# Altium footprint library domino-rising-cage-clamp.PcbLib: 435 footprints (part 21 of 28)
Each footprint in its own frame and in the unit in brackets; x right, y up, seen from the top. Pads: shape width x height; smd on the part's side, far side on the other; paste and mask are expansions set on the pad; w line width, h text height; cw(c..) or ccw(c..) is an arc to the next point about the centre after c.
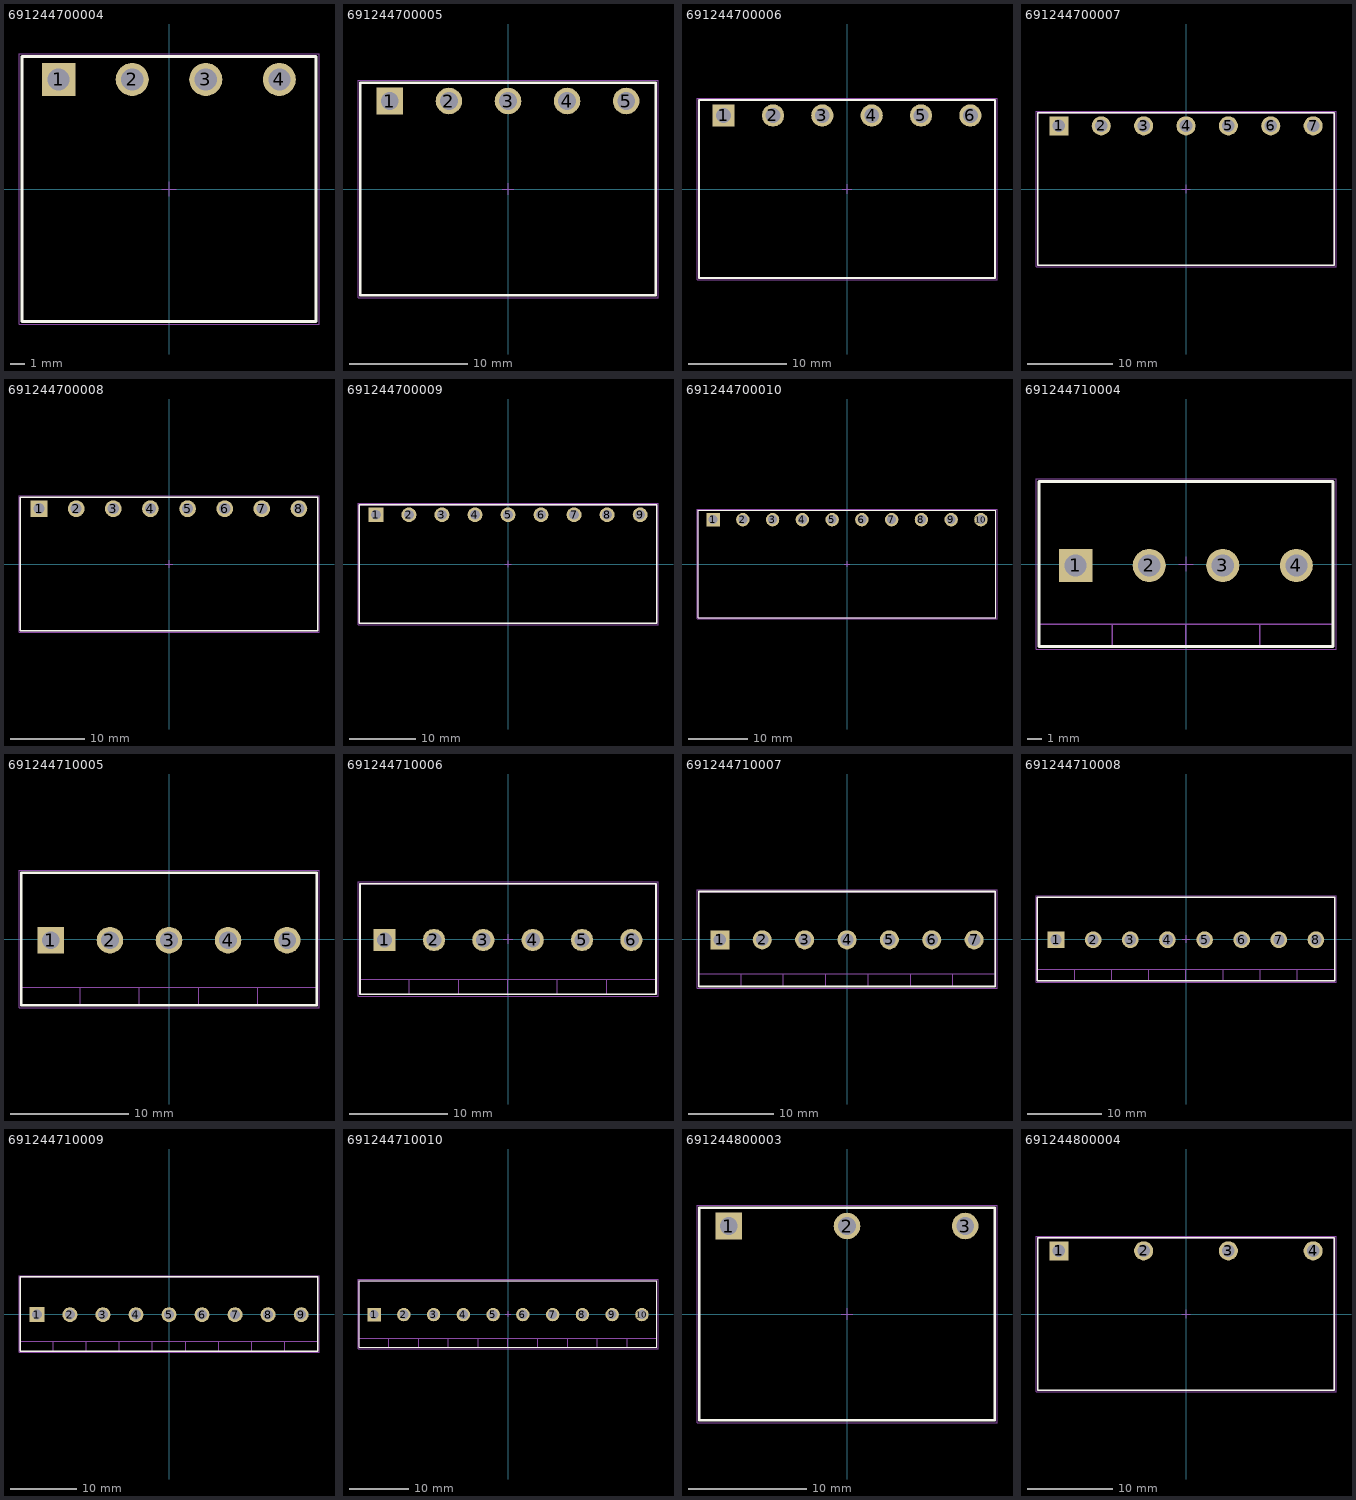
[diagram p20: the footprints below, top view; thin cyan lines are the x and y axes]

## 691244700004 [mm] "Serie 2447 - 5.00 mm _ 4 pins"
height 11.2
pads (4):
  rect 2.25x2.25 hole 1.5: 1(-7.5,7.45)
  round 2.25 hole 1.5: 2(-2.5,7.45) 3(2.5,7.45) 4(7.5,7.45)
Top Overlay:
  lines w0.2: -10,-9 10,-9 10,9 -10,9 -10,-9
Mechanical 13:
  lines w0.1: -10,-9 -10,9 10,9 10,-9 -10,-9
Mechanical 15:
  lines w0.05: -0.5,0 0.5,0 ; 0,-0.5 0,0.5 ; -10.2,-9.2 10.2,-9.2 10.2,9.2 -10.2,9.2 -10.2,-9.2
3D body "691244700004.stp": height 11.3, standoff -3.9, extent -10,-9 10,9

## 691244700005 [mm] "Serie 2447 - 5.00 mm _ 5 pins"
height 11.2
pads (5):
  rect 2.25x2.25 hole 1.5: 1(-10,7.45)
  round 2.25 hole 1.5: 2(-5,7.45) 3(0,7.45) 4(5,7.45) 5(10,7.45)
Top Overlay:
  lines w0.2: -12.5,-9 12.5,-9 12.5,9 -12.5,9 -12.5,-9
Mechanical 13:
  lines w0.1: -12.5,-9 -12.5,9 12.5,9 12.5,-9 -12.5,-9
Mechanical 15:
  lines w0.05: -0.5,0 0.5,0 ; 0,-0.5 0,0.5 ; -12.7,-9.2 12.7,-9.2 12.7,9.2 -12.7,9.2 -12.7,-9.2
3D body "691244700005.stp": height 11.3, standoff -3.9, extent -12.5,-9 12.5,9

## 691244700006 [mm] "Serie 2447 - 5.00 mm _ 6 pins"
height 11.2
pads (6):
  rect 2.25x2.25 hole 1.5: 1(-12.5,7.45)
  round 2.25 hole 1.5: 2(-7.5,7.45) 3(-2.5,7.45) 4(2.5,7.45) 5(7.5,7.45) 6(12.5,7.45)
Top Overlay:
  lines w0.2: -15,-9 15,-9 15,9 -15,9 -15,-9
Mechanical 13:
  lines w0.1: -15,-9 -15,9 15,9 15,-9 -15,-9
Mechanical 15:
  lines w0.05: -0.5,0 0.5,0 ; 0,-0.5 0,0.5 ; -15.2,-9.2 15.2,-9.2 15.2,9.2 -15.2,9.2 -15.2,-9.2
3D body "691244700006.stp": height 11.3, standoff -3.9, extent -15,-9 15,9

## 691244700007 [mm] "Serie 2447 - 5.00 mm _ 7 pins"
height 11.2
pads (7):
  rect 2.25x2.25 hole 1.5: 1(-15,7.45)
  round 2.25 hole 1.5: 2(-10,7.45) 3(-5,7.45) 4(0,7.45) 5(5,7.45) 6(10,7.45) 7(15,7.45)
Top Overlay:
  lines w0.2: -17.5,-9 17.5,-9 17.5,9 -17.5,9 -17.5,-9
Mechanical 13:
  lines w0.1: -17.5,-9 -17.5,9 17.5,9 17.5,-9 -17.5,-9
Mechanical 15:
  lines w0.05: -0.5,0 0.5,0 ; 0,-0.5 0,0.5 ; -17.7,-9.2 17.7,-9.2 17.7,9.2 -17.7,9.2 -17.7,-9.2
3D body "691244700007.stp": height 11.3, standoff -3.9, extent -17.5,-9 17.5,9

## 691244700008 [mm] "Serie 2447 - 5.00 mm _ 8 pins"
height 11.2
pads (8):
  rect 2.25x2.25 hole 1.5: 1(-17.5,7.45)
  round 2.25 hole 1.5: 2(-12.5,7.45) 3(-7.5,7.45) 4(-2.5,7.45) 5(2.5,7.45) 6(7.5,7.45) 7(12.5,7.45) 8(17.5,7.45)
Top Overlay:
  lines w0.2: -20,-9 -20,9 20,9 20,-9 -20,-9
Mechanical 13:
  lines w0.1: -20,-9 20,-9 20,9 -20,9 -20,-9
Mechanical 15:
  lines w0.05: -0.5,0 0.5,0 ; 0,-0.5 0,0.5 ; -20.2,-9.2 -20.2,9.2 20.2,9.2 20.2,-9.2 -20.2,-9.2
3D body "691244700008.stp": height 11.3, standoff -3.9, extent -20,-9 20,9

## 691244700009 [mm] "Serie 2447 - 5.00 mm _ 9 pins"
height 11.2
pads (9):
  rect 2.25x2.25 hole 1.5: 1(-20,7.45)
  round 2.25 hole 1.5: 2(-15,7.45) 3(-10,7.45) 4(-5,7.45) 5(0,7.45) 6(5,7.45) 7(10,7.45) 8(15,7.45) 9(20,7.45)
Top Overlay:
  lines w0.2: -22.5,-9 -22.5,9 22.5,9 22.5,-9 -22.5,-9
Mechanical 13:
  lines w0.1: -22.5,-9 22.5,-9 22.5,9 -22.5,9 -22.5,-9
Mechanical 15:
  lines w0.05: -0.5,0 0.5,0 ; 0,-0.5 0,0.5 ; -22.7,-9.2 -22.7,9.2 22.7,9.2 22.7,-9.2 -22.7,-9.2
3D body "691244700009.stp": height 11.3, standoff -3.9, extent -22.5,-9 22.5,9

## 691244700010 [mm] "Serie 2447 - 5.00 mm _ 10 pins"
height 11.2
pads (10):
  rect 2.25x2.25 hole 1.5: 1(-22.5,7.45)
  round 2.25 hole 1.5: 2(-17.5,7.45) 3(-12.5,7.45) 4(-7.5,7.45) 5(-2.5,7.45) 6(2.5,7.45) 7(7.5,7.45) 8(12.5,7.45) 9(17.5,7.45) 10(22.5,7.45)
Top Overlay:
  lines w0.2: -25,-9 25,-9 25,9 -25,9 -25,-9
Mechanical 13:
  lines w0.1: -25,-9 -25,9 25,9 25,-9 -25,-9
Mechanical 15:
  lines w0.05: -0.5,0 0.5,0 ; 0,-0.5 0,0.5 ; -25.2,-9.2 25.2,-9.2 25.2,9.2 -25.2,9.2 -25.2,-9.2
3D body "691244700010.stp": height 11.3, standoff -3.9, extent -25,-9 25,9

## 691244710004 [mm] "Serie 2447 - 5.00 mm _ 4 pins"
height 18
pads (4):
  rect 2.25x2.25 hole 1.5: 1(-7.5,-0.1)
  round 2.25 hole 1.5: 2(-2.5,-0.1) 3(2.5,-0.1) 4(7.5,-0.1)
Top Overlay:
  lines w0.2: -10,-5.6 -10,5.6 10,5.6 10,-5.6 -10,-5.6
Mechanical 13:
  lines w0.1: -10,-4.1 10,-4.1 ; -5,-5.6 -5,-4.1 ; 0,-5.6 0,-4.1 ; 5,-5.6 5,-4.1 ; -10,-5.6 10,-5.6 10,5.6 -10,5.6 -10,-5.6
Mechanical 15:
  lines w0.05: -0.5,0 0.5,0 ; 0,-0.5 0,0.5 ; -10.2,-5.8 -10.2,5.8 10.2,5.8 10.2,-5.8 -10.2,-5.8
3D body "691244710004.stp": height 18.05, standoff -3.95, extent -10,-5.6 10,5.6

## 691244710005 [mm] "Serie 2447 - 5.00 mm _ 5 pins"
height 18
pads (5):
  rect 2.25x2.25 hole 1.5: 1(-10,-0.1)
  round 2.25 hole 1.5: 2(-5,-0.1) 3(0,-0.1) 4(5,-0.1) 5(10,-0.1)
Top Overlay:
  lines w0.2: -12.5,-5.6 -12.5,5.6 12.5,5.6 12.5,-5.6 -12.5,-5.6
Mechanical 13:
  lines w0.1: -12.5,-4.1 12.5,-4.1 ; -7.5,-5.6 -7.5,-4.1 ; -2.5,-5.6 -2.5,-4.1 ; 2.5,-5.6 2.5,-4.1 ; 7.5,-5.6 7.5,-4.1 ; -12.5,-5.6 12.5,-5.6 12.5,5.6 -12.5,5.6 -12.5,-5.6
Mechanical 15:
  lines w0.05: -0.5,0 0.5,0 ; 0,-0.5 0,0.5 ; -12.7,-5.8 -12.7,5.8 12.7,5.8 12.7,-5.8 -12.7,-5.8
3D body "691244710005.stp": height 18.05, standoff -3.95, extent -12.5,-5.6 12.5,5.6

## 691244710006 [mm] "Serie 2447 - 5.00 mm _ 6 pins"
height 18
pads (6):
  rect 2.25x2.25 hole 1.5: 1(-12.5,-0.1)
  round 2.25 hole 1.5: 2(-7.5,-0.1) 3(-2.5,-0.1) 4(2.5,-0.1) 5(7.5,-0.1) 6(12.5,-0.1)
Top Overlay:
  lines w0.2: -15,-5.6 -15,5.6 15,5.6 15,-5.6 -15,-5.6
Mechanical 13:
  lines w0.1: -15,-4.1 15,-4.1 ; -10,-5.6 -10,-4.1 ; -5,-5.6 -5,-4.1 ; 0,-5.6 0,-4.1 ; 5,-5.6 5,-4.1 ; 10,-5.6 10,-4.1 ; -15,-5.6 15,-5.6 15,5.6 -15,5.6 -15,-5.6
Mechanical 15:
  lines w0.05: -0.5,0 0.5,0 ; 0,-0.5 0,0.5 ; -15.2,-5.8 -15.2,5.8 15.2,5.8 15.2,-5.8 -15.2,-5.8
3D body "691244710006.stp": height 18.05, standoff -3.95, extent -15,-5.6 15,5.6

## 691244710007 [mm] "Serie 2447 - 5.00 mm _ 7 pins"
height 18
pads (7):
  rect 2.25x2.25 hole 1.5: 1(-15,-0.1)
  round 2.25 hole 1.5: 2(-10,-0.1) 3(-5,-0.1) 4(0,-0.1) 5(5,-0.1) 6(10,-0.1) 7(15,-0.1)
Top Overlay:
  lines w0.2: -17.5,-5.6 -17.5,5.6 17.5,5.6 17.5,-5.6 -17.5,-5.6
Mechanical 13:
  lines w0.1: -17.5,-4.1 17.5,-4.1 ; -12.5,-5.6 -12.5,-4.1 ; -7.5,-5.6 -7.5,-4.1 ; -2.5,-5.6 -2.5,-4.1 ; 2.5,-5.6 2.5,-4.1 ; 7.5,-5.6 7.5,-4.1 ; 12.5,-5.6 12.5,-4.1 ; -17.5,-5.6 17.5,-5.6 17.5,5.6 -17.5,5.6 -17.5,-5.6
Mechanical 15:
  lines w0.05: -0.5,0 0.5,0 ; 0,-0.5 0,0.5 ; -17.7,-5.8 -17.7,5.8 17.7,5.8 17.7,-5.8 -17.7,-5.8
3D body "691244710007.stp": height 18.05, standoff -3.95, extent -17.5,-5.6 17.5,5.6

## 691244710008 [mm] "Serie 2447 - 5.00 mm _ 8 pins"
height 18
pads (8):
  rect 2.25x2.25 hole 1.5: 1(-17.5,-0.1)
  round 2.25 hole 1.5: 2(-12.5,-0.1) 3(-7.5,-0.1) 4(-2.5,-0.1) 5(2.5,-0.1) 6(7.5,-0.1) 7(12.5,-0.1) 8(17.5,-0.1)
Top Overlay:
  lines w0.2: -20,-5.6 20,-5.6 20,5.6 -20,5.6 -20,-5.6
Mechanical 13:
  lines w0.1: -20,-4.1 20,-4.1 ; -15,-5.6 -15,-4.1 ; -10,-5.6 -10,-4.1 ; -5,-5.6 -5,-4.1 ; 0,-5.6 0,-4.1 ; 5,-5.6 5,-4.1 ; 10,-5.6 10,-4.1 ; 15,-5.6 15,-4.1 ; -20,-5.6 -20,5.6 20,5.6 20,-5.6 -20,-5.6
Mechanical 15:
  lines w0.05: -0.5,0 0.5,0 ; 0,-0.5 0,0.5 ; -20.2,-5.8 20.2,-5.8 20.2,5.8 -20.2,5.8 -20.2,-5.8
3D body "691244710008.stp": height 18.05, standoff -3.95, extent -20,-5.6 20,5.6

## 691244710009 [mm] "Serie 2447 - 5.00 mm _ 9 pins"
height 18
pads (9):
  rect 2.25x2.25 hole 1.5: 1(-20,-0.1)
  round 2.25 hole 1.5: 2(-15,-0.1) 3(-10,-0.1) 4(-5,-0.1) 5(0,-0.1) 6(5,-0.1) 7(10,-0.1) 8(15,-0.1) 9(20,-0.1)
Top Overlay:
  lines w0.2: -22.5,-5.6 -22.5,5.6 22.5,5.6 22.5,-5.6 -22.5,-5.6
Mechanical 13:
  lines w0.1: -22.5,-4.1 22.5,-4.1 ; -17.5,-5.6 -17.5,-4.1 ; -12.5,-5.6 -12.5,-4.1 ; -7.5,-5.6 -7.5,-4.1 ; -2.5,-5.6 -2.5,-4.1 ; 2.5,-5.6 2.5,-4.1 ; 7.5,-5.6 7.5,-4.1 ; 12.5,-5.6 12.5,-4.1 ; 17.5,-5.6 17.5,-4.1 ; -22.5,-5.6 22.5,-5.6 22.5,5.6 -22.5,5.6 -22.5,-5.6
Mechanical 15:
  lines w0.05: -0.5,0 0.5,0 ; 0,-0.5 0,0.5 ; -22.7,-5.8 -22.7,5.8 22.7,5.8 22.7,-5.8 -22.7,-5.8
3D body "691244710009.stp": height 18.05, standoff -3.95, extent -22.5,-5.6 22.5,5.6

## 691244710010 [mm] "Serie 2447 - 5.00 mm _ 10 pins"
height 18
pads (10):
  rect 2.25x2.25 hole 1.5: 1(-22.5,-0.1)
  round 2.25 hole 1.5: 2(-17.5,-0.1) 3(-12.5,-0.1) 4(-7.5,-0.1) 5(-2.5,-0.1) 6(2.5,-0.1) 7(7.5,-0.1) 8(12.5,-0.1) 9(17.5,-0.1) 10(22.5,-0.1)
Top Overlay:
  lines w0.2: -25,-5.6 -25,5.6 25,5.6 25,-5.6 -25,-5.6
Mechanical 13:
  lines w0.1: -25,-4.1 25,-4.1 ; -20,-5.6 -20,-4.1 ; -15,-5.6 -15,-4.1 ; -10,-5.6 -10,-4.1 ; -5,-5.6 -5,-4.1 ; 0,-5.6 0,-4.1 ; 5,-5.6 5,-4.1 ; 10,-5.6 10,-4.1 ; 15,-5.6 15,-4.1 ; 20,-5.6 20,-4.1 ; -25,-5.6 25,-5.6 25,5.6 -25,5.6 -25,-5.6
Mechanical 15:
  lines w0.05: -0.5,0 0.5,0 ; 0,-0.5 0,0.5 ; -25.2,-5.8 -25.2,5.8 25.2,5.8 25.2,-5.8 -25.2,-5.8
3D body "691244710010.stp": height 18.05, standoff -3.95, extent -25,-5.6 25,5.6

## 691244800003 [mm] "Serie 2448 - 10.00 mm _ 3 pins"
height 11.2
pads (3):
  rect 2.25x2.25 hole 1.5: 1(-10,7.45)
  round 2.25 hole 1.5: 2(0,7.45) 3(10,7.45)
Top Overlay:
  lines w0.2: -12.5,-9 -12.5,9 12.5,9 12.5,-9 -12.5,-9
Mechanical 13:
  lines w0.1: -12.5,-9 12.5,-9 12.5,9 -12.5,9 -12.5,-9
Mechanical 15:
  lines w0.05: -0.5,0 0.5,0 ; 0,-0.5 0,0.5 ; -12.7,-9.2 -12.7,9.2 12.7,9.2 12.7,-9.2 -12.7,-9.2
3D body "691244800003.stp": height 11.3, standoff -3.9, extent -12.5,-9.05 12.5,8.95

## 691244800004 [mm] "Serie 2448 - 10.00 mm _ 4 pins"
height 11.2
pads (4):
  rect 2.25x2.25 hole 1.5: 1(-15,7.45)
  round 2.25 hole 1.5: 2(-5,7.45) 3(5,7.45) 4(15,7.45)
Top Overlay:
  lines w0.2: -17.5,-9 17.5,-9 17.5,9 -17.5,9 -17.5,-9
Mechanical 13:
  lines w0.1: -17.5,-9 -17.5,9 17.5,9 17.5,-9 -17.5,-9
Mechanical 15:
  lines w0.05: -0.5,0 0.5,0 ; 0,-0.5 0,0.5 ; -17.7,-9.2 17.7,-9.2 17.7,9.2 -17.7,9.2 -17.7,-9.2
3D body "691244800004.stp": height 11.3, standoff -3.9, extent -17.5,-9.05 17.5,8.95